# Altium footprint library Footprint.PcbLib: 137 footprints (part 8 of 9)
Each footprint in its own frame and in the unit in brackets; x right, y up, seen from the top. Pads: shape width x height; smd on the part's side, far side on the other; paste and mask are expansions set on the pad; w line width, h text height; cw(c..) or ccw(c..) is an arc to the next point about the centre after c.
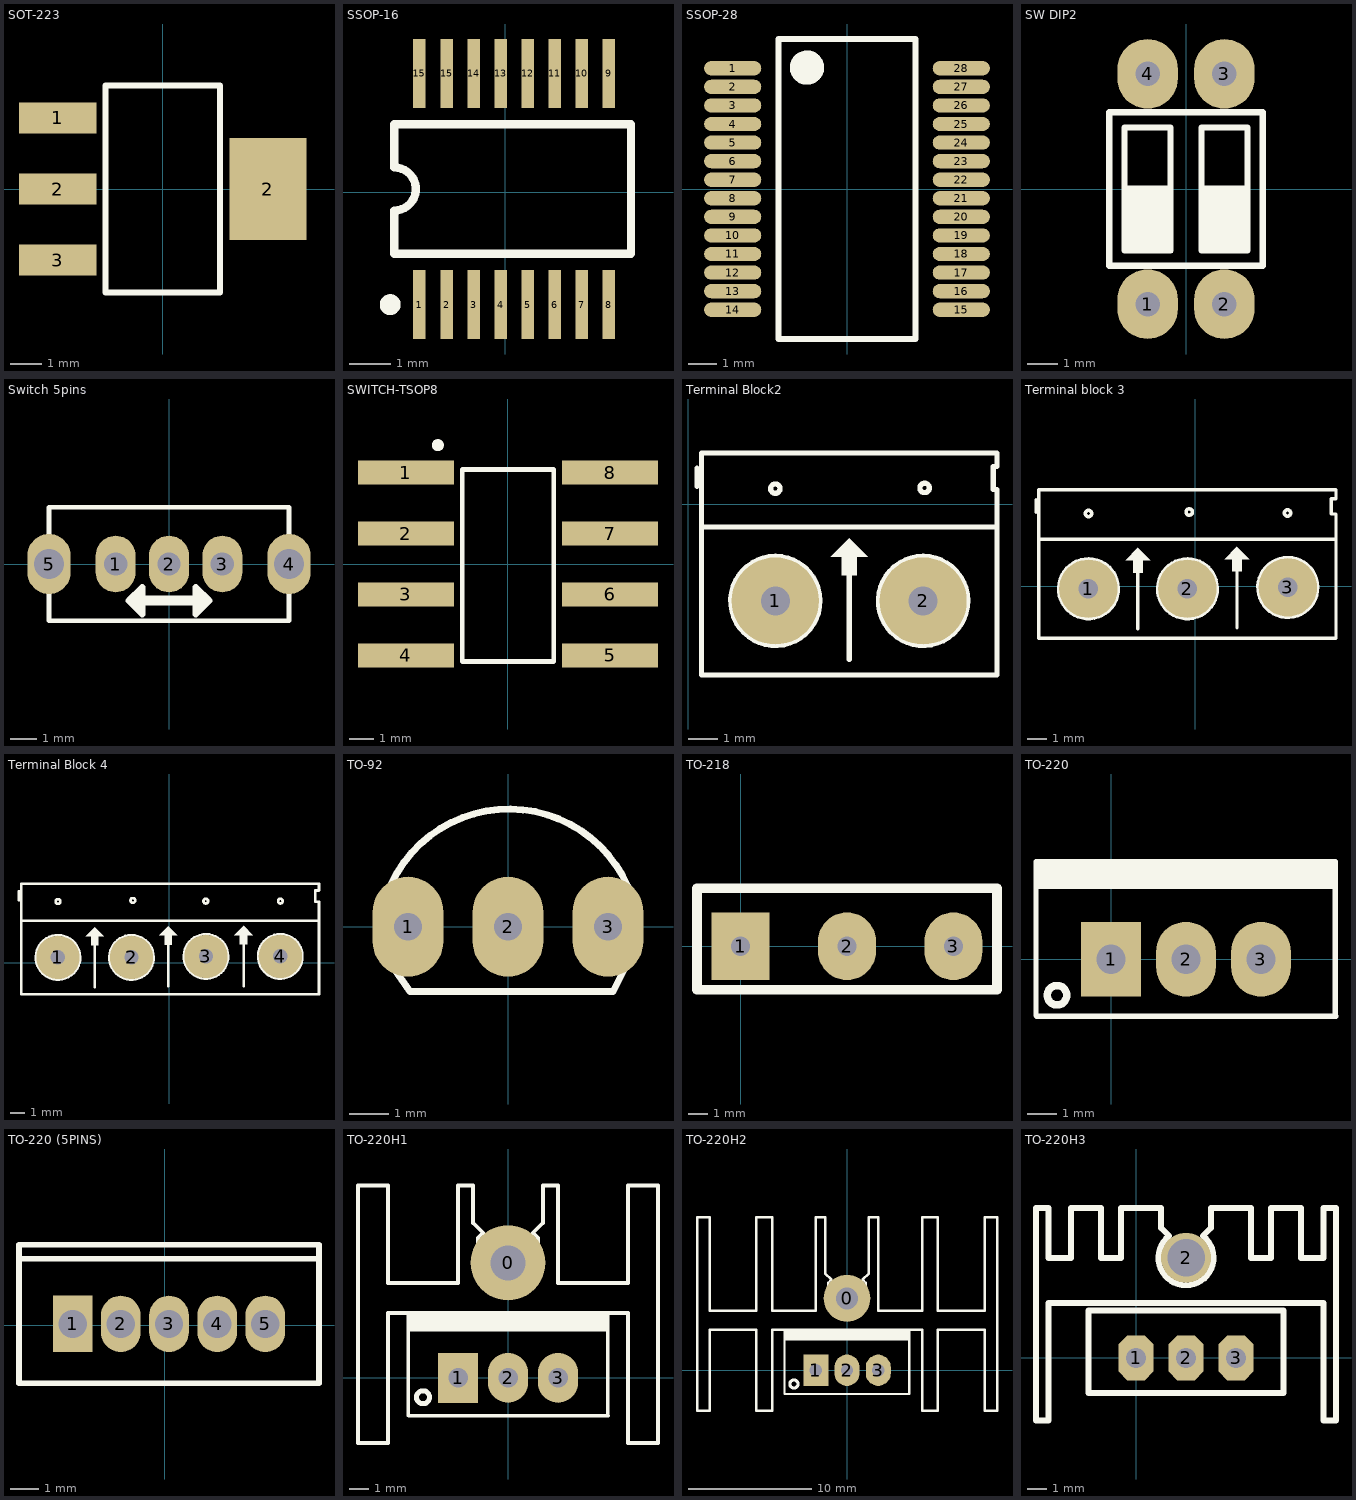
[diagram p7: the footprints below, top view; thin cyan lines are the x and y axes]

## SOT-223 [mm] "SOT223, 4-Leads, Body 6.50x7.00mm Pitch 2.30mm"
height 1.7
pads (4):
  rect 2.5x1 smd: 1(-3.4,2.3) 2(-3.4,0) 3(-3.4,-2.3)
  rect 2.5x3.3 smd: 2(3.4,0)
Top Overlay:
  lines w0.2: -1.85,-3.35 -1.85,3.35 1.85,3.35 1.85,-3.35 -1.85,-3.35
3D body "SOT-223.step": height 1.7, standoff 0, extent -3.5,-3.35 3.5,3.35

## SSOP-16 [mm] "SSOP-16 PITCH=25MILS"
pads (16):
  rect 0.3x1.65 smd: 1(-2.057,-2.692) 2(-1.397,-2.692) 3(-0.757,-2.692) 4(-0.107,-2.692) 5(0.543,-2.692) 6(1.193,-2.692) 7(1.843,-2.692) 8(2.489,-2.692) 9(2.489,2.858) 10(1.843,2.858) 11(1.193,2.858) 12(0.543,2.858) 13(-0.107,2.858) 14(-0.757,2.858) 15(-2.057,2.858) 15(-1.397,2.858)
Top Overlay:
  circle w0.25: c-2.757,-2.692 r0.125
  lines w0.2: -2.657,-1.467 -2.657,-0.434 ccw(c-2.657,0.083) -2.657,0.599 -2.657,1.633 3.023,1.633 3.023,-1.467 -2.657,-1.467
3D body "User Library-ssop16p500x440ls065h200.step": height 2, standoff 0, extent -2.297,-3.098 2.703,3.302

## SSOP-28 [mm] "SSOP-28"
height 2
pads (28):
  oval 2x0.5 smd: 1(-4,4.225) 2(-4,3.575) 3(-4,2.925) 4(-4,2.275) 5(-4,1.625) 6(-4,0.975) 7(-4,0.325) 8(-4,-0.325) 9(-4,-0.975) 10(-4,-1.625) 11(-4,-2.275) 12(-4,-2.925) 13(-4,-3.575) 14(-4,-4.225) 15(4,-4.225) 16(4,-3.575) 17(4,-2.925) 18(4,-2.275) 19(4,-1.625) 20(4,-0.975) 21(4,-0.325) 22(4,0.325) 23(4,0.975) 24(4,1.625) 25(4,2.275) 26(4,2.925) 27(4,3.575) 28(4,4.225)
Top Overlay:
  circle w0.6: c-1.4,4.25 r0.3
  lines w0.2: -2.4,-5.25 -2.4,5.25 2.4,5.25 2.4,-5.25 -2.4,-5.25
3D body "SSOP-28.step": height 2, standoff 0, extent -3.9,-5.25 3.9,5.25

## SW DIP2 [mm] "SW GAT DIP2"
pads (4):
  oval 2x2.3 hole 0.813: 1(-1.27,-3.81) 2(1.27,-3.81) 3(1.27,3.81) 4(-1.27,3.81)
Top Overlay:
  region: -0.43,0.078 -0.43,-2.11 -1.954,-2.11 -2.032,-2.032 -2.032,-1.016 -2.032,0 -2.032,0.11 -0.508,0.11
  region: 2.11,0.078 2.032,0 2.032,-1.905 2.032,-2.032 0.508,-2.032 0.618,-2.032 0.508,-2.032 0.508,-1.016 0.508,0 0.43,0.078 0.508,0.11 2.032,0.11
  lines w0.203: -2.54,-2.54 -2.54,1.27 -2.54,2.54 2.54,2.54 2.54,-2.54 -2.54,-2.54 ; -2.032,-2.032 -0.508,-2.032 -0.508,2.032 -2.032,2.032 -2.032,-2.032 ; 0.508,-2.032 2.032,-2.032 2.032,2.032 0.508,2.032 0.508,-2.032
3D body "User Library-DIP-Switch-2.step": height 3.7, standoff -7, extent -3.032,-4.95 3.048,4.95

## Switch 5pins [mil] "Switch 5pins"
pads (5):
  oval 60x85 hole 35: 1(-80,0) 2(0,0) 3(80,0)
  oval 65x90 hole 45: 4(180,0) 5(-180,0)
Top Overlay:
  lines w7: -180,-45 -180,-85 180,-85 180,-45 ; -180,45 -180,85 180,85 180,45
  lines w10: -60,-55 -40,-75 -40,-35 -60,-55 ; 40,-75 60,-55 40,-35 40,-75
  lines w15: -50,-55 50,-55

## SWITCH-TSOP8 [mm] "SW-TSOP8"
height 3.7
pads (8):
  rect 4x1 smd: 1(-4.25,3.81) 2(-4.25,1.27) 3(-4.25,-1.27) 4(-4.25,-3.81) 5(4.25,-3.81) 6(4.25,-1.27) 7(4.25,1.27) 8(4.25,3.81)
Top Overlay:
  circle w0.25: c-2.921,4.953 r0.125
  lines w0.2: -1.905,-4.064 1.905,-4.064 1.905,3.937 -1.905,3.937 -1.905,-4.064
3D body "19716.stp": height 3.7, standoff 0, extent -4.773,-5.55 5.027,5.55

## Terminal Block2 [mm] "Terminal Blcok 2 position,pitch=5mm"
pads (2):
  round 3 hole 1: 1(2.997,-3.327) 2(8.077,-3.327)
Top Overlay:
  circle w0.178: c2.997,0.533 r0.163
  circle w0.178: c8.128,0.559 r0.163
  region: 5.537,-1.168 4.902,-1.803 5.283,-1.803 5.283,-2.438 5.791,-2.438 5.791,-1.803 6.172,-1.803
  lines w0.178: 0.305,0.61 0.305,1.245 ; 0.508,-0.787 10.592,-0.787 ; 3.984,-2.153 ccw(c2.997,-3.327) 4.016,-2.181 ; 5.537,-5.334 5.537,-1.499 ; 9.061,-2.151 ccw(c8.077,-3.327) 9.096,-2.181 ; 0.457,-5.867 10.617,-5.867 10.617,0.508 10.49,0.508 10.49,1.295 10.617,1.295 10.617,1.753 0.457,1.753 0.457,-2.057 0.457,-5.867
3D body "SW3dPS-KRM2.STEP": height 10, standoff -4, extent 0.664,-6.883 10.664,0.617

## Terminal block 3 [mm] "Terminal block 3 position, pitch=5mm"
pads (3):
  round 3 hole 1: 1(-5.486,-0.127) 2(-0.406,-0.127) 3(4.74,-0.06)
Top Overlay:
  circle w0.178: c4.724,3.759 r0.163
  circle w0.178: c-5.486,3.734 r0.163
  circle w0.178: c-0.315,3.81 r0.163
  region: 2.134,2.032 1.499,1.397 1.88,1.397 1.88,0.762 2.388,0.762 2.388,1.397 2.769,1.397
  region: -2.946,1.968 -3.581,1.333 -3.2,1.333 -3.2,0.699 -2.692,0.699 -2.692,1.333 -2.311,1.333
  lines w0.178: -8.179,3.81 -8.179,4.445 ; -8.026,2.413 7.214,2.413 ; -6.553,-1.194 -4.394,0.965 ; -4.485,1.034 ccw(c-5.486,-0.127) -4.344,0.896 ; -2.946,-2.184 -2.946,1.651 ; -1.46,-1.181 0.686,0.965 ; 0.581,1.046 ccw(c-0.406,-0.127) 0.746,0.884 ; 2.134,-2.134 2.134,1.702 ; 3.658,-1.118 5.817,1.016 ; 5.731,1.11 ccw(c4.74,-0.06) 5.898,0.945 ; -8.026,-2.667 7.214,-2.667 7.214,3.708 6.96,3.708 6.96,4.496 7.214,4.496 7.214,4.953 -8.026,4.953 -8.026,1.143 -8.026,-2.667
3D body "User Library-Terminal block 3 POS.STEP": height 10.1, standoff -2.95, extent -8.001,-3.309 7.239,4.191

## Terminal Block 4 [mm] "terminal block 4pos,pitch=5mm"
pads (4):
  round 3 hole 1: 1(-7.671,0.356) 2(-2.591,0.356) 3(2.556,0.422) 4(7.696,0.432)
Top Overlay:
  circle w0.178: c7.696,4.242 r0.163
  circle w0.178: c-2.499,4.293 r0.163
  circle w0.178: c-7.671,4.216 r0.163
  circle w0.178: c2.54,4.242 r0.163
  region: 5.156,2.527 4.521,1.892 4.902,1.892 4.902,1.257 5.41,1.257 5.41,1.892 5.791,1.892
  region: -5.131,2.451 -5.766,1.816 -5.385,1.816 -5.385,1.181 -4.877,1.181 -4.877,1.816 -4.496,1.816
  region: -0.051,2.515 -0.686,1.88 -0.305,1.88 -0.305,1.245 0.203,1.245 0.203,1.88 0.584,1.88
  lines w0.178: -10.363,4.293 -10.363,4.928 ; -10.211,2.896 10.338,2.896 ; -8.738,-0.711 -6.579,1.448 ; -6.669,1.517 ccw(c-7.671,0.356) -6.529,1.379 ; -5.131,-1.702 -5.131,2.134 ; -3.645,-0.699 -1.499,1.448 ; -1.603,1.529 ccw(c-2.591,0.356) -1.438,1.367 ; -0.051,-1.651 -0.051,2.184 ; 1.473,-0.635 3.632,1.499 ; 3.547,1.592 ccw(c2.556,0.422) 3.714,1.427 ; 5.156,-1.626 5.156,2.21 ; 6.643,-0.635 8.802,1.499 ; 8.678,1.592 ccw(c7.687,0.422) 8.707,1.566 ; 10.338,-2.184 -10.211,-2.184 -10.211,1.626 -10.211,5.436 10.363,5.436 10.363,4.978 10.109,4.978 10.109,4.191 10.363,4.191 10.363,-2.184
3D body "4pos.stp": height 14.5, standoff -2.5, extent -10.554,-4.089 9.996,4.911

## TO-92 [mm] "TO-92"
height 5.08
pads (3):
  oval 1.8x2.54 hole 0.7: 1(-2.54,0) 2(0,0) 3(2.54,0)
Top Overlay:
  lines w0.178: -2.96,1.098 cw(c0.025,-0.316) 3.046,1.015 ; -2.93,-1.022 -2.489,-1.651 2.667,-1.651 2.997,-0.991
3D body "SW3dPS-TO92.STEP": height 6.22, standoff -5.07, extent -2.765,-1.665 2.765,2.413

## TO-218 [mm] "TO-218 (3PIN),PITCH=5.5MM"
pads (3):
  rect 3x3.5 hole 1: 1(0,0)
  oval 3x3.5 hole 1: 2(5.5,0) 3(11,0)
Top Overlay:
  lines w0.5: -2.25,-2.25 13.25,-2.25 13.25,3 -2.25,3 -2.25,2.5 -2.25,-2.25
3D body "User Library-TO218.STEP": height 22.23, standoff -3, extent -2,-2.05 13,2.75

## TO-220 [mil] "TO-220 - 1-2-3"
height 200
pads (3):
  rect 80x100 hole 39: 1(0,0)
  oval 80x100 hole 39: 2(100,0) 3(200,0)
Top Overlay:
  circle w10: c-72.03,-48 r12.97
  rectangle: -99,94 300,130
  lines w7: 298,107 299,93 ; -100,-75 -99,-76 -76,-76 300,-76 299,-75 299,130 -100,130 -100,-75
3D body "SW3dPS-TO220AB.STEP": height 754.72, standoff -400, extent -119,-64 322.46,120.65

## TO-220 (5PINS) [mm] "TO-220 (5PINS),PITCH=1.8MM"
pads (5):
  rect 1.4x2 hole 1: 1(-3.242,0.04)
  oval 1.4x2 hole 1: 2(-1.542,0.04) 3(0.158,0.04) 4(1.858,0.04) 5(3.558,0.04)
Top Overlay:
  lines w0.2: -5.142,2.34 5.458,2.34 ; -5.142,-2.06 -5.142,2.84 5.458,2.84 5.458,-2.06 -5.142,-2.06

## TO-220H1 [mil] "TO-220 - 1-2-3"
height 200
pads (4):
  round 150 hole 70: 0(0,230)
  rect 80x100 hole 39: 1(-100,0)
  oval 80x100 hole 39: 2(0,0) 3(100,0)
Top Overlay:
  circle w10: c-170.03,-39 r12.97
  rectangle: -201,93 198,129
  lines w7: -200,100 198.5,100 199,93 ; -200,-75 -199,-76 -176,-76 200,-76 199,-75 199,130 -200,130 -200,-75
  lines w8: -300,-130 -300,385 -240,385 -240,190 -100,190 -100,385 -70,385 -70,310 -50,290 -60,280 -60,210 -40,190 40,190 60,210 60,280 50,290 70,310 70,385 100,385 100,190 240,190 240,385 300,385 300,-130 240,-130 240,130 -240,130 -240,-130 -300,-130
3D body "User Library-Disipador 34M8491-1.STEP": height 1000, standoff -122.05, extent -246,73.03 250.06,328.97
3D body "User Library-TO-220-1.STEP": height 850.24, standoff -282.83, extent -194.88,-82 194.88,95.17

## TO-220H2 [mil] "TO-220 - 1-2-3"
height 200
pads (4):
  round 150 hole 70: 0(0,230)
  rect 80x100 hole 39: 1(-100,0)
  oval 80x100 hole 39: 2(0,0) 3(100,0)
Top Overlay:
  circle w10: c-169.97,-44 r12.97
  rectangle: -201,95 198,131
  lines w7: -200,100 198.5,100 199,93 ; -200,-75 -200,130 199,130 199,-75 200,-76 -176,-76 -199,-76 -200,-75
  lines w8: -480,-130 -440,-130 -440,130 -290,130 -290,-130 -240,-130 -240,130 240,130 240,-130 290,-130 290,130 440,130 440,-130 480,-130 480,490 440,490 440,190 290,190 290,490 240,490 240,190 100,190 100,490 70,490 70,310 50,290 60,280 60,210 40,190 -40,190 -60,210 -60,280 -50,290 -70,310 -70,490 -100,490 -100,190 -240,190 -240,490 -290,490 -290,190 -440,190 -440,490 -480,490 -480,-130
3D body "User Library-heat sink-1.STEP": height 1205.51, standoff 0, extent -448.79,-177 452.79,468.67
3D body "User Library-TO-220-1.STEP": height 810.24, standoff -322.83, extent -194.76,-82.17 195,95

## TO-220H3 [mil] "TO-220 1-2-3"
pads (4):
  oct 70x90 hole 40: 1(0,0) 2(100,0) 3(200,0)
  round 100 hole 75: 2(100,200)
Top Overlay:
  lines w12: 66,244 50,260 50,300 -30,300 -30,200 -70,200 -70,300 -130,300 -130,200 -175,200 -175,300 -200,300 -200,-125 -175,-125 -175,110 375,110 375,-125 400,-125 400,300 375,300 375,200 330,200 330,300 270,300 270,200 230,200 230,300 150,300 150,260 133.59,243.59 ; 66.37,243.52 ccw(c100,200) 133.77,243.41 ; -95,-70 295,-70 295,95 -95,95 -95,-70
3D body "User Library-TO-220-1.STEP": height 322.83, standoff -810.24, extent -96.88,-76.17 292.88,101
3D body "SW3dPS-heatsink TO126.STEP": height 984.25, standoff -149.61, extent -189.97,-102.25 391.97,323